# Altium footprint library 排针-排母-1.27.PcbLib: 152 footprints (part 1 of 10)
Each footprint in its own frame and in the unit in brackets; x right, y up, seen from the top. Pads: shape width x height; smd on the part's side, far side on the other; paste and mask are expansions set on the pad; w line width, h text height; cw(c..) or ccw(c..) is an arc to the next point about the centre after c.
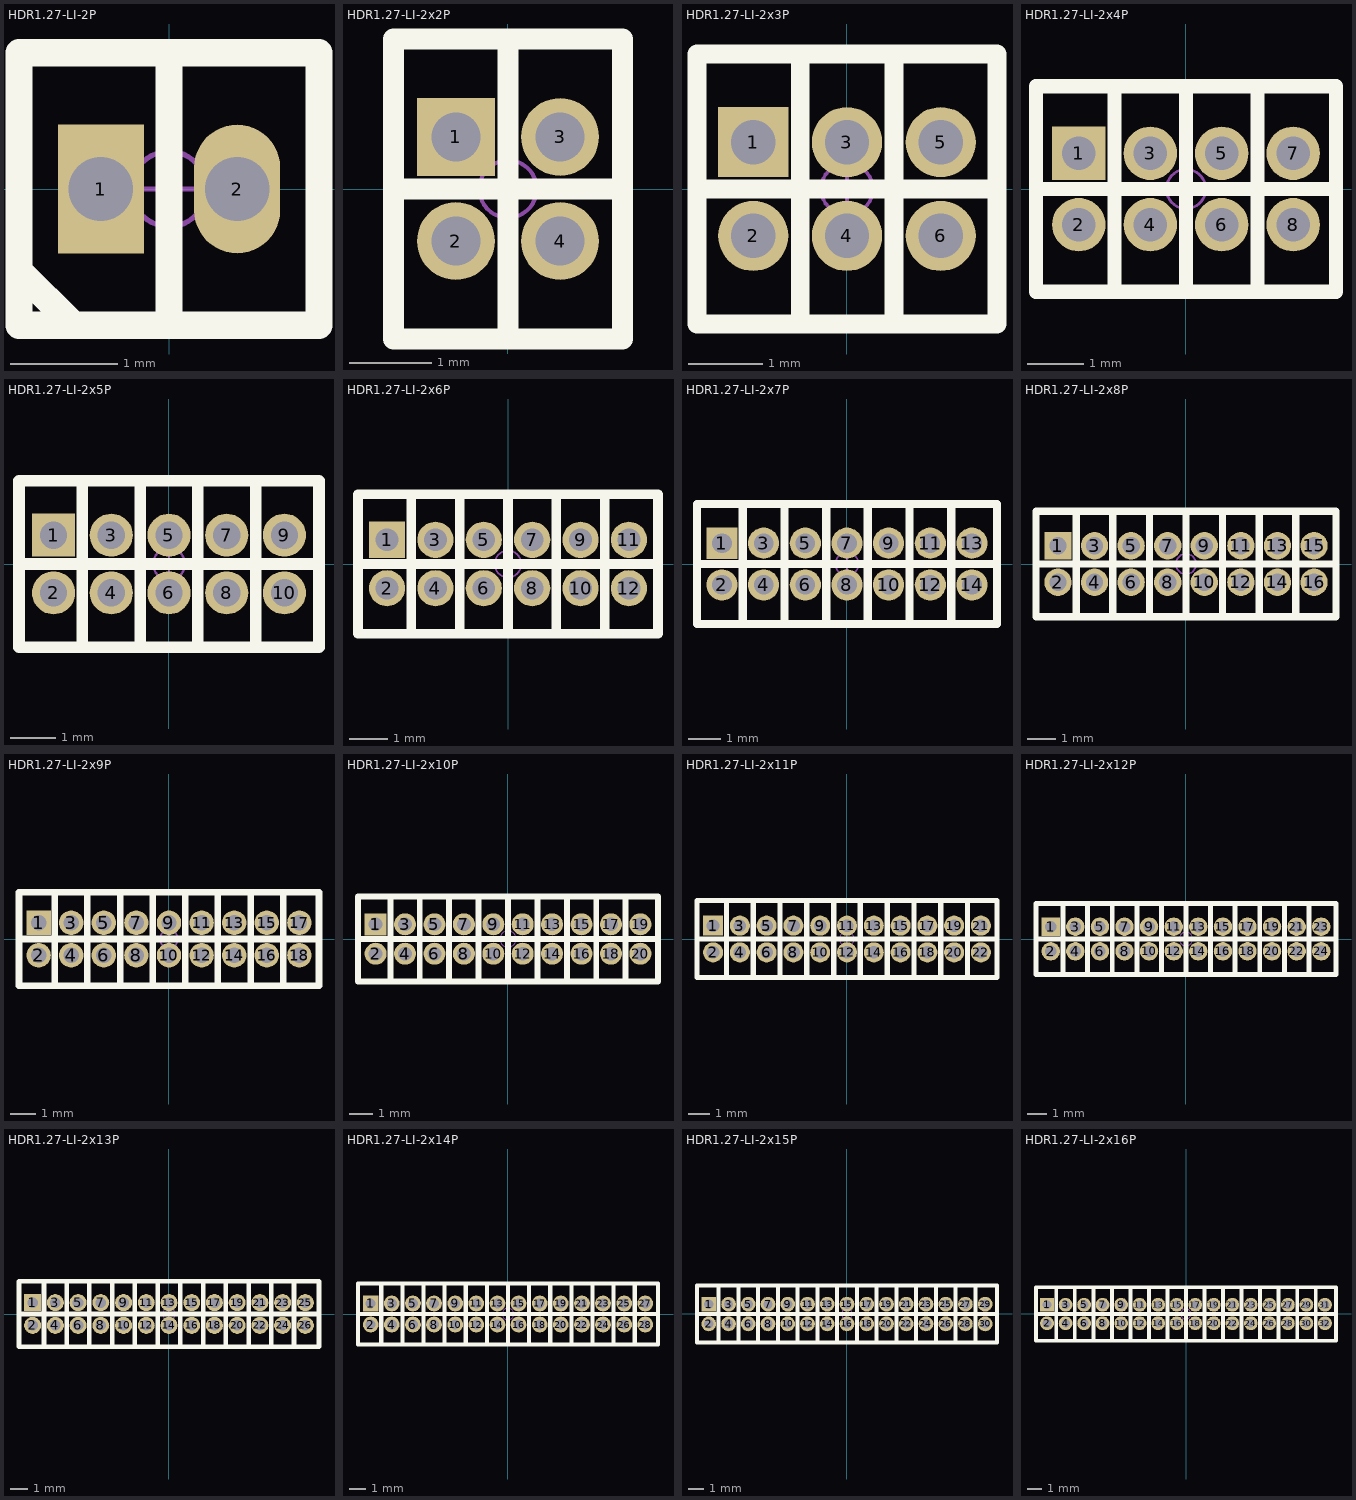
[diagram p0: the footprints below, top view; thin cyan lines are the x and y axes]

## HDR1.27-LI-2P [mm] "直插，脚距：1.27mm"
pads (2):
  rect 0.8x1.2 hole 0.6: 1(-0.635,0)
  oval 0.8x1.2 hole 0.6: 2(0.635,0)
Top Overlay:
  lines w0.254: -1.397,-0.762 -0.889,-1.27 ; 0,-1.27 0,1.27 ; -1.397,-1.27 -1.397,1.27 1.397,1.27 1.397,-1.27 -1.397,-1.27
Mechanical 15:
  circle w0.05: c0,0 r0.35
  lines w0.05: -0.5,0 0.5,0 ; 0,-0.5 0,0.5
3D body: height 4.48, standoff -2.72, extent -1.27,-1.2 1.27,1.2

## HDR1.27-LI-2x2P [mm] "双排直插，脚距：1.27mm"
pads (4):
  rect 0.95x0.95 hole 0.6: 1(-0.635,0.635)
  round 0.95 hole 0.6: 2(-0.635,-0.635) 3(0.635,0.635) 4(0.635,-0.635)
Top Overlay:
  lines w0.254: -1.397,0 1.397,0 ; 0,-1.829 0,1.829 ; -1.397,-1.829 1.397,-1.829 1.397,1.829 -1.397,1.829 -1.397,-1.829
Mechanical 15:
  circle w0.05: c0,0 r0.35
  lines w0.05: -0.5,0 0.5,0 ; 0,-0.5 0,0.5
3D body: height 3.85, standoff -2.65, extent 0,-1.7 1.27,1.7
3D body: height 3.85, standoff -2.65, extent -1.27,-1.7 0,1.7

## HDR1.27-LI-2x3P [mm] "双排直插，脚距：1.27mm"
pads (6):
  rect 0.95x0.95 hole 0.6: 1(-1.27,0.635)
  round 0.95 hole 0.6: 2(-1.27,-0.635) 3(0,0.635) 4(0,-0.635) 5(1.27,0.635) 6(1.27,-0.635)
Top Overlay:
  lines w0.254: -2.032,0 2.032,0 ; -0.635,-1.829 -0.635,1.829 ; 0.635,-1.829 0.635,1.829 ; -2.032,-1.829 -2.032,1.829 2.032,1.829 2.032,-1.829 -2.032,-1.829
Mechanical 15:
  circle w0.05: c0,0 r0.35
  lines w0.05: -0.5,0 0.5,0 ; 0,-0.5 0,0.5
3D body: height 3.85, standoff -2.65, extent -1.905,-1.7 -0.635,1.7
3D body: height 3.85, standoff -2.65, extent -0.635,-1.7 0.635,1.7
3D body: height 3.85, standoff -2.65, extent 0.635,-1.7 1.905,1.7

## HDR1.27-LI-2x4P [mm] "双排直插，脚距：1.27mm"
pads (8):
  rect 0.95x0.95 hole 0.6: 1(-1.905,0.635)
  round 0.95 hole 0.6: 2(-1.905,-0.635) 3(-0.635,0.635) 4(-0.635,-0.635) 5(0.635,0.635) 6(0.635,-0.635) 7(1.905,0.635) 8(1.905,-0.635)
Top Overlay:
  lines w0.254: -2.667,0 2.667,0 ; -1.27,-1.829 -1.27,1.829 ; 0,-1.829 0,1.829 ; 1.27,-1.829 1.27,1.829 ; -2.667,-1.829 -2.667,1.829 2.667,1.829 2.667,-1.829 -2.667,-1.829
Mechanical 15:
  circle w0.05: c0,0 r0.35
  lines w0.05: -0.5,0 0.5,0 ; 0,-0.5 0,0.5
3D body: height 3.85, standoff -2.65, extent 1.27,-1.7 2.54,1.7
3D body: height 3.85, standoff -2.65, extent -2.54,-1.7 -1.27,1.7
3D body: height 3.85, standoff -2.65, extent -1.27,-1.7 0,1.7
3D body: height 3.85, standoff -2.65, extent 0,-1.7 1.27,1.7

## HDR1.27-LI-2x5P [mm] "双排直插，脚距：1.27mm"
pads (10):
  rect 0.95x0.95 hole 0.6: 1(-2.54,0.635)
  round 0.95 hole 0.6: 2(-2.54,-0.635) 3(-1.27,0.635) 4(-1.27,-0.635) 5(0,0.635) 6(0,-0.635) 7(1.27,0.635) 8(1.27,-0.635) 9(2.54,0.635) 10(2.54,-0.635)
Top Overlay:
  lines w0.254: -3.302,0 3.302,0 ; -1.905,-1.829 -1.905,1.829 ; -0.635,-1.829 -0.635,1.829 ; 0.635,-1.829 0.635,1.829 ; 1.905,-1.829 1.905,1.829 ; -3.302,-1.829 3.302,-1.829 3.302,1.829 -3.302,1.829 -3.302,-1.829
Mechanical 15:
  circle w0.05: c0,0 r0.35
  lines w0.05: -0.5,0 0.5,0 ; 0,-0.5 0,0.5
3D body: height 3.85, standoff -2.65, extent -0.635,-1.7 0.635,1.7
3D body: height 3.85, standoff -2.65, extent -1.905,-1.7 -0.635,1.7
3D body: height 3.85, standoff -2.65, extent -3.175,-1.7 -1.905,1.7
3D body: height 3.85, standoff -2.65, extent 0.635,-1.7 1.905,1.7
3D body: height 3.85, standoff -2.65, extent 1.905,-1.7 3.175,1.7

## HDR1.27-LI-2x6P [mm] "双排直插，脚距：1.27mm"
pads (12):
  rect 0.95x0.95 hole 0.6: 1(-3.175,0.635)
  round 0.95 hole 0.6: 2(-3.175,-0.635) 3(-1.905,0.635) 4(-1.905,-0.635) 5(-0.635,0.635) 6(-0.635,-0.635) 7(0.635,0.635) 8(0.635,-0.635) 9(1.905,0.635) 10(1.905,-0.635) 11(3.175,0.635) 12(3.175,-0.635)
Top Overlay:
  lines w0.254: -3.937,0 3.81,0 ; -2.54,-1.829 -2.54,1.829 ; -1.27,-1.829 -1.27,1.829 ; 0,-1.829 0,1.829 ; 1.27,-1.829 1.27,1.829 ; 2.54,-1.829 2.54,1.829 ; -3.937,-1.829 -3.937,1.829 3.937,1.829 3.937,-1.829 -3.937,-1.829
Mechanical 15:
  circle w0.05: c0,0 r0.35
  lines w0.05: -0.5,0 0.5,0 ; 0,-0.5 0,0.5
3D body: height 3.85, standoff -2.65, extent 2.54,-1.7 3.81,1.7
3D body: height 3.85, standoff -2.65, extent 1.27,-1.7 2.54,1.7
3D body: height 3.85, standoff -2.65, extent 0,-1.7 1.27,1.7
3D body: height 3.85, standoff -2.65, extent -3.81,-1.7 -2.54,1.7
3D body: height 3.85, standoff -2.65, extent -2.54,-1.7 -1.27,1.7
3D body: height 3.85, standoff -2.65, extent -1.27,-1.7 0,1.7

## HDR1.27-LI-2x7P [mm] "双排直插，脚距：1.27mm"
pads (14):
  rect 0.95x0.95 hole 0.6: 1(-3.81,0.635)
  round 0.95 hole 0.6: 2(-3.81,-0.635) 3(-2.54,0.635) 4(-2.54,-0.635) 5(-1.27,0.635) 6(-1.27,-0.635) 7(0,0.635) 8(0,-0.635) 9(1.27,0.635) 10(1.27,-0.635) 11(2.54,0.635) 12(2.54,-0.635) 13(3.81,0.635) 14(3.81,-0.635)
Top Overlay:
  lines w0.254: -4.572,0 4.572,0 ; -3.175,-1.829 -3.175,1.829 ; -1.905,-1.829 -1.905,1.829 ; -0.635,-1.829 -0.635,1.829 ; 0.635,-1.829 0.635,1.829 ; 1.905,-1.829 1.905,1.829 ; 3.175,-1.829 3.175,1.829 ; -4.572,-1.829 4.572,-1.829 4.572,1.829 -4.572,1.829 -4.572,-1.829
Mechanical 15:
  circle w0.05: c0,0 r0.35
  lines w0.05: -0.5,0 0.5,0 ; 0,-0.5 0,0.5
3D body: height 3.85, standoff -2.65, extent -1.905,-1.7 -0.635,1.7
3D body: height 3.85, standoff -2.65, extent -3.175,-1.7 -1.905,1.7
3D body: height 3.85, standoff -2.65, extent -4.445,-1.7 -3.175,1.7
3D body: height 3.85, standoff -2.65, extent -0.635,-1.7 0.635,1.7
3D body: height 3.85, standoff -2.65, extent 0.635,-1.7 1.905,1.7
3D body: height 3.85, standoff -2.65, extent 1.905,-1.7 3.175,1.7
3D body: height 3.85, standoff -2.65, extent 3.175,-1.7 4.445,1.7

## HDR1.27-LI-2x8P [mm] "双排直插，脚距：1.27mm"
pads (16):
  rect 0.95x0.95 hole 0.6: 1(-4.445,0.635)
  round 0.95 hole 0.6: 2(-4.445,-0.635) 3(-3.175,0.635) 4(-3.175,-0.635) 5(-1.905,0.635) 6(-1.905,-0.635) 7(-0.635,0.635) 8(-0.635,-0.635) 9(0.635,0.635) 10(0.635,-0.635) 11(1.905,0.635) 12(1.905,-0.635) 13(3.175,0.635) 14(3.175,-0.635) 15(4.445,0.635) 16(4.445,-0.635)
Top Overlay:
  lines w0.254: -5.207,0 5.207,0 ; -3.81,-1.829 -3.81,1.829 ; -2.54,-1.829 -2.54,1.829 ; -1.27,-1.829 -1.27,1.829 ; 0,-1.829 0,1.829 ; 1.27,-1.829 1.27,1.829 ; 2.54,-1.829 2.54,1.829 ; 3.81,-1.829 3.81,1.829 ; -5.207,-1.829 5.207,-1.829 5.207,1.829 -5.207,1.829 -5.207,-1.829
Mechanical 15:
  circle w0.05: c0,0 r0.35
  lines w0.05: -0.5,0 0.5,0 ; 0,-0.5 0,0.5
3D body: height 3.85, standoff -2.65, extent -2.54,-1.7 -1.27,1.7
3D body: height 3.85, standoff -2.65, extent -3.81,-1.7 -2.54,1.7
3D body: height 3.85, standoff -2.65, extent -5.08,-1.7 -3.81,1.7
3D body: height 3.85, standoff -2.65, extent -1.27,-1.7 0,1.7
3D body: height 3.85, standoff -2.65, extent 0,-1.7 1.27,1.7
3D body: height 3.85, standoff -2.65, extent 1.27,-1.7 2.54,1.7
3D body: height 3.85, standoff -2.65, extent 2.54,-1.7 3.81,1.7
3D body: height 3.85, standoff -2.65, extent 3.81,-1.7 5.08,1.7

## HDR1.27-LI-2x9P [mm] "双排直插，脚距：1.27mm"
pads (18):
  rect 0.95x0.95 hole 0.6: 1(-5.08,0.635)
  round 0.95 hole 0.6: 2(-5.08,-0.635) 3(-3.81,0.635) 4(-3.81,-0.635) 5(-2.54,0.635) 6(-2.54,-0.635) 7(-1.27,0.635) 8(-1.27,-0.635) 9(0,0.635) 10(0,-0.635) 11(1.27,0.635) 12(1.27,-0.635) 13(2.54,0.635) 14(2.54,-0.635) 15(3.81,0.635) 16(3.81,-0.635) 17(5.08,0.635) 18(5.08,-0.635)
Top Overlay:
  lines w0.254: -5.842,0 5.842,0 ; -4.445,-1.829 -4.445,1.829 ; -3.175,-1.829 -3.175,1.829 ; -1.905,-1.829 -1.905,1.829 ; -0.635,-1.829 -0.635,1.829 ; 0.635,-1.829 0.635,1.829 ; 1.905,-1.829 1.905,1.829 ; 3.175,-1.829 3.175,1.829 ; 4.445,-1.829 4.445,1.829 ; -5.842,-1.829 5.842,-1.829 5.842,1.829 -5.842,1.829 -5.842,-1.829
Mechanical 15:
  circle w0.05: c0,0 r0.35
  lines w0.05: -0.5,0 0.5,0 ; 0,-0.5 0,0.5
3D body: height 3.85, standoff -2.65, extent -3.175,-1.7 -1.905,1.7
3D body: height 3.85, standoff -2.65, extent -4.445,-1.7 -3.175,1.7
3D body: height 3.85, standoff -2.65, extent -5.715,-1.7 -4.445,1.7
3D body: height 3.85, standoff -2.65, extent -1.905,-1.7 -0.635,1.7
3D body: height 3.85, standoff -2.65, extent -0.635,-1.7 0.635,1.7
3D body: height 3.85, standoff -2.65, extent 0.635,-1.7 1.905,1.7
3D body: height 3.85, standoff -2.65, extent 1.905,-1.7 3.175,1.7
3D body: height 3.85, standoff -2.65, extent 3.175,-1.7 4.445,1.7
3D body: height 3.85, standoff -2.65, extent 4.445,-1.7 5.715,1.7

## HDR1.27-LI-2x10P [mm] "双排直插，脚距：1.27mm"
pads (20):
  rect 0.95x0.95 hole 0.6: 1(-5.715,0.635)
  round 0.95 hole 0.6: 2(-5.715,-0.635) 3(-4.445,0.635) 4(-4.445,-0.635) 5(-3.175,0.635) 6(-3.175,-0.635) 7(-1.905,0.635) 8(-1.905,-0.635) 9(-0.635,0.635) 10(-0.635,-0.635) 11(0.635,0.635) 12(0.635,-0.635) 13(1.905,0.635) 14(1.905,-0.635) 15(3.175,0.635) 16(3.175,-0.635) 17(4.445,0.635) 18(4.445,-0.635) 19(5.715,0.635) 20(5.715,-0.635)
Top Overlay:
  lines w0.254: -6.477,0 6.477,0 ; -5.08,-1.829 -5.08,1.829 ; -3.81,-1.829 -3.81,1.829 ; -2.54,-1.829 -2.54,1.829 ; -1.27,-1.829 -1.27,1.829 ; 0,-1.829 0,1.829 ; 1.27,-1.829 1.27,1.829 ; 2.54,-1.829 2.54,1.829 ; 3.81,-1.829 3.81,1.829 ; 5.08,-1.829 5.08,1.829 ; -6.477,-1.829 -6.477,1.829 6.477,1.829 6.477,-1.829 -6.477,-1.829
Mechanical 15:
  circle w0.05: c0,0 r0.35
  lines w0.05: -0.5,0 0.5,0 ; 0,-0.5 0,0.5
3D body: height 3.85, standoff -2.65, extent 5.08,-1.7 6.35,1.7
3D body: height 3.85, standoff -2.65, extent 3.81,-1.7 5.08,1.7
3D body: height 3.85, standoff -2.65, extent 2.54,-1.7 3.81,1.7
3D body: height 3.85, standoff -2.65, extent 1.27,-1.7 2.54,1.7
3D body: height 3.85, standoff -2.65, extent 0,-1.7 1.27,1.7
3D body: height 3.85, standoff -2.65, extent -1.27,-1.7 0,1.7
3D body: height 3.85, standoff -2.65, extent -2.54,-1.7 -1.27,1.7
3D body: height 3.85, standoff -2.65, extent -6.35,-1.7 -5.08,1.7
3D body: height 3.85, standoff -2.65, extent -5.08,-1.7 -3.81,1.7
3D body: height 3.85, standoff -2.65, extent -3.81,-1.7 -2.54,1.7

## HDR1.27-LI-2x11P [mm] "双排直插，脚距：1.27mm"
pads (22):
  rect 0.95x0.95 hole 0.6: 1(-6.35,0.635)
  round 0.95 hole 0.6: 2(-6.35,-0.635) 3(-5.08,0.635) 4(-5.08,-0.635) 5(-3.81,0.635) 6(-3.81,-0.635) 7(-2.54,0.635) 8(-2.54,-0.635) 9(-1.27,0.635) 10(-1.27,-0.635) 11(0,0.635) 12(0,-0.635) 13(1.27,0.635) 14(1.27,-0.635) 15(2.54,0.635) 16(2.54,-0.635) 17(3.81,0.635) 18(3.81,-0.635) 19(5.08,0.635) 20(5.08,-0.635) 21(6.35,0.635) 22(6.35,-0.635)
Top Overlay:
  lines w0.254: -7.112,0 7.112,0 ; -5.715,-1.829 -5.715,1.829 ; -4.445,-1.829 -4.445,1.829 ; -3.175,-1.829 -3.175,1.829 ; -1.905,-1.829 -1.905,1.829 ; -0.635,-1.829 -0.635,1.829 ; 0.635,-1.829 0.635,1.829 ; 1.905,-1.829 1.905,1.829 ; 3.175,-1.829 3.175,1.829 ; 4.445,-1.829 4.445,1.829 ; 5.715,-1.829 5.715,1.829 ; -7.112,-1.829 7.112,-1.829 7.112,1.829 -7.112,1.829 -7.112,-1.829
Mechanical 15:
  circle w0.05: c0,0 r0.35
  lines w0.05: -0.5,0 0.5,0 ; 0,-0.5 0,0.5
3D body: height 3.85, standoff -2.65, extent -4.445,-1.7 -3.175,1.7
3D body: height 3.85, standoff -2.65, extent -5.715,-1.7 -4.445,1.7
3D body: height 3.85, standoff -2.65, extent -6.985,-1.7 -5.715,1.7
3D body: height 3.85, standoff -2.65, extent -3.175,-1.7 -1.905,1.7
3D body: height 3.85, standoff -2.65, extent -1.905,-1.7 -0.635,1.7
3D body: height 3.85, standoff -2.65, extent -0.635,-1.7 0.635,1.7
3D body: height 3.85, standoff -2.65, extent 0.635,-1.7 1.905,1.7
3D body: height 3.85, standoff -2.65, extent 1.905,-1.7 3.175,1.7
3D body: height 3.85, standoff -2.65, extent 3.175,-1.7 4.445,1.7
3D body: height 3.85, standoff -2.65, extent 4.445,-1.7 5.715,1.7
3D body: height 3.85, standoff -2.65, extent 5.715,-1.7 6.985,1.7

## HDR1.27-LI-2x12P [mm] "双排直插，脚距：1.27mm"
pads (24):
  rect 0.95x0.95 hole 0.6: 1(-6.985,0.635)
  round 0.95 hole 0.6: 2(-6.985,-0.635) 3(-5.715,0.635) 4(-5.715,-0.635) 5(-4.445,0.635) 6(-4.445,-0.635) 7(-3.175,0.635) 8(-3.175,-0.635) 9(-1.905,0.635) 10(-1.905,-0.635) 11(-0.635,0.635) 12(-0.635,-0.635) 13(0.635,0.635) 14(0.635,-0.635) 15(1.905,0.635) 16(1.905,-0.635) 17(3.175,0.635) 18(3.175,-0.635) 19(4.445,0.635) 20(4.445,-0.635) 21(5.715,0.635) 22(5.715,-0.635) 23(6.985,0.635) 24(6.985,-0.635)
Top Overlay:
  lines w0.254: -7.747,0 7.747,0 ; -6.35,-1.829 -6.35,1.829 ; -5.08,-1.829 -5.08,1.829 ; -3.81,-1.829 -3.81,1.829 ; -2.54,-1.829 -2.54,1.829 ; -1.27,-1.829 -1.27,1.829 ; 0,-1.829 0,1.829 ; 1.27,-1.829 1.27,1.829 ; 2.54,-1.829 2.54,1.829 ; 3.81,-1.829 3.81,1.829 ; 5.08,-1.829 5.08,1.829 ; 6.35,-1.829 6.35,1.829 ; -7.747,-1.829 7.747,-1.829 7.747,1.829 -7.747,1.829 -7.747,-1.829
Mechanical 15:
  circle w0.05: c0,0 r0.35
  lines w0.05: -0.5,0 0.5,0 ; 0,-0.5 0,0.5
3D body: height 3.85, standoff -2.65, extent -5.08,-1.7 -3.81,1.7
3D body: height 3.85, standoff -2.65, extent -6.35,-1.7 -5.08,1.7
3D body: height 3.85, standoff -2.65, extent -7.62,-1.7 -6.35,1.7
3D body: height 3.85, standoff -2.65, extent -3.81,-1.7 -2.54,1.7
3D body: height 3.85, standoff -2.65, extent -2.54,-1.7 -1.27,1.7
3D body: height 3.85, standoff -2.65, extent -1.27,-1.7 0,1.7
3D body: height 3.85, standoff -2.65, extent 0,-1.7 1.27,1.7
3D body: height 3.85, standoff -2.65, extent 1.27,-1.7 2.54,1.7
3D body: height 3.85, standoff -2.65, extent 2.54,-1.7 3.81,1.7
3D body: height 3.85, standoff -2.65, extent 3.81,-1.7 5.08,1.7
3D body: height 3.85, standoff -2.65, extent 5.08,-1.7 6.35,1.7
3D body: height 3.85, standoff -2.65, extent 6.35,-1.7 7.62,1.7

## HDR1.27-LI-2x13P [mm] "双排直插，脚距：1.27mm"
pads (26):
  rect 0.95x0.95 hole 0.6: 1(-7.62,0.635)
  round 0.95 hole 0.6: 2(-7.62,-0.635) 3(-6.35,0.635) 4(-6.35,-0.635) 5(-5.08,0.635) 6(-5.08,-0.635) 7(-3.81,0.635) 8(-3.81,-0.635) 9(-2.54,0.635) 10(-2.54,-0.635) 11(-1.27,0.635) 12(-1.27,-0.635) 13(0,0.635) 14(0,-0.635) 15(1.27,0.635) 16(1.27,-0.635) 17(2.54,0.635) 18(2.54,-0.635) 19(3.81,0.635) 20(3.81,-0.635) 21(5.08,0.635) 22(5.08,-0.635) 23(6.35,0.635) 24(6.35,-0.635) 25(7.62,0.635) 26(7.62,-0.635)
Top Overlay:
  lines w0.254: -8.382,0 8.382,0 ; -6.985,-1.829 -6.985,1.829 ; -5.715,-1.829 -5.715,1.829 ; -4.445,-1.829 -4.445,1.829 ; -3.175,-1.829 -3.175,1.829 ; -1.905,-1.829 -1.905,1.829 ; -0.635,-1.829 -0.635,1.829 ; 0.635,-1.829 0.635,1.829 ; 1.905,-1.829 1.905,1.829 ; 3.175,-1.829 3.175,1.829 ; 4.445,-1.829 4.445,1.829 ; 5.715,-1.829 5.715,1.829 ; 6.985,-1.829 6.985,1.829 ; -8.382,-1.829 -8.382,1.829 8.382,1.829 8.382,-1.829 -8.382,-1.829
Mechanical 15:
  circle w0.05: c0,0 r0.35
  lines w0.05: -0.5,0 0.5,0 ; 0,-0.5 0,0.5
3D body: height 3.85, standoff -2.65, extent 6.985,-1.7 8.255,1.7
3D body: height 3.85, standoff -2.65, extent 5.715,-1.7 6.985,1.7
3D body: height 3.85, standoff -2.65, extent 4.445,-1.7 5.715,1.7
3D body: height 3.85, standoff -2.65, extent 3.175,-1.7 4.445,1.7
3D body: height 3.85, standoff -2.65, extent 1.905,-1.7 3.175,1.7
3D body: height 3.85, standoff -2.65, extent 0.635,-1.7 1.905,1.7
3D body: height 3.85, standoff -2.65, extent -0.635,-1.7 0.635,1.7
3D body: height 3.85, standoff -2.65, extent -1.905,-1.7 -0.635,1.7
3D body: height 3.85, standoff -2.65, extent -3.175,-1.7 -1.905,1.7
3D body: height 3.85, standoff -2.65, extent -4.445,-1.7 -3.175,1.7
3D body: height 3.85, standoff -2.65, extent -8.255,-1.7 -6.985,1.7
3D body: height 3.85, standoff -2.65, extent -6.985,-1.7 -5.715,1.7
3D body: height 3.85, standoff -2.65, extent -5.715,-1.7 -4.445,1.7

## HDR1.27-LI-2x14P [mm] "双排直插，脚距：1.27mm"
pads (28):
  rect 0.95x0.95 hole 0.6: 1(-8.255,0.635)
  round 0.95 hole 0.6: 2(-8.255,-0.635) 3(-6.985,0.635) 4(-6.985,-0.635) 5(-5.715,0.635) 6(-5.715,-0.635) 7(-4.445,0.635) 8(-4.445,-0.635) 9(-3.175,0.635) 10(-3.175,-0.635) 11(-1.905,0.635) 12(-1.905,-0.635) 13(-0.635,0.635) 14(-0.635,-0.635) 15(0.635,0.635) 16(0.635,-0.635) 17(1.905,0.635) 18(1.905,-0.635) 19(3.175,0.635) 20(3.175,-0.635) 21(4.445,0.635) 22(4.445,-0.635) 23(5.715,0.635) 24(5.715,-0.635) 25(6.985,0.635) 26(6.985,-0.635) 27(8.255,0.635) 28(8.255,-0.635)
Top Overlay:
  lines w0.254: -9.017,0 9.017,0 ; -7.62,-1.829 -7.62,1.829 ; -6.35,-1.829 -6.35,1.829 ; -5.08,-1.829 -5.08,1.829 ; -3.81,-1.829 -3.81,1.829 ; -2.54,-1.829 -2.54,1.829 ; -1.27,-1.829 -1.27,1.829 ; 0,-1.829 0,1.829 ; 1.27,-1.829 1.27,1.829 ; 2.54,-1.829 2.54,1.829 ; 3.81,-1.829 3.81,1.829 ; 5.08,-1.829 5.08,1.829 ; 6.35,-1.829 6.35,1.829 ; 7.62,-1.829 7.62,1.829 ; -9.017,-1.829 -9.017,1.829 9.017,1.829 9.017,-1.829 -9.017,-1.829
Mechanical 15:
  circle w0.05: c0,0 r0.35
  lines w0.05: -0.5,0 0.5,0 ; 0,-0.5 0,0.5
3D body: height 3.85, standoff -2.65, extent 7.62,-1.7 8.89,1.7
3D body: height 3.85, standoff -2.65, extent 6.35,-1.7 7.62,1.7
3D body: height 3.85, standoff -2.65, extent 5.08,-1.7 6.35,1.7
3D body: height 3.85, standoff -2.65, extent 3.81,-1.7 5.08,1.7
3D body: height 3.85, standoff -2.65, extent 2.54,-1.7 3.81,1.7
3D body: height 3.85, standoff -2.65, extent 1.27,-1.7 2.54,1.7
3D body: height 3.85, standoff -2.65, extent 0,-1.7 1.27,1.7
3D body: height 3.85, standoff -2.65, extent -1.27,-1.7 0,1.7
3D body: height 3.85, standoff -2.65, extent -2.54,-1.7 -1.27,1.7
3D body: height 3.85, standoff -2.65, extent -3.81,-1.7 -2.54,1.7
3D body: height 3.85, standoff -2.65, extent -5.08,-1.7 -3.81,1.7
3D body: height 3.85, standoff -2.65, extent -8.89,-1.7 -7.62,1.7
3D body: height 3.85, standoff -2.65, extent -7.62,-1.7 -6.35,1.7
3D body: height 3.85, standoff -2.65, extent -6.35,-1.7 -5.08,1.7

## HDR1.27-LI-2x15P [mm] "双排直插，脚距：1.27mm"
pads (30):
  rect 0.95x0.95 hole 0.6: 1(-8.89,0.635)
  round 0.95 hole 0.6: 2(-8.89,-0.635) 3(-7.62,0.635) 4(-7.62,-0.635) 5(-6.35,0.635) 6(-6.35,-0.635) 7(-5.08,0.635) 8(-5.08,-0.635) 9(-3.81,0.635) 10(-3.81,-0.635) 11(-2.54,0.635) 12(-2.54,-0.635) 13(-1.27,0.635) 14(-1.27,-0.635) 15(0,0.635) 16(0,-0.635) 17(1.27,0.635) 18(1.27,-0.635) 19(2.54,0.635) 20(2.54,-0.635) 21(3.81,0.635) 22(3.81,-0.635) 23(5.08,0.635) 24(5.08,-0.635) 25(6.35,0.635) 26(6.35,-0.635) 27(7.62,0.635) 28(7.62,-0.635) 29(8.89,0.635) 30(8.89,-0.635)
Top Overlay:
  lines w0.254: -9.652,0 9.652,0 ; -8.255,-1.829 -8.255,1.829 ; -6.985,-1.829 -6.985,1.829 ; -5.715,-1.829 -5.715,1.829 ; -4.445,-1.829 -4.445,1.829 ; -3.175,-1.829 -3.175,1.829 ; -1.905,-1.829 -1.905,1.829 ; -0.635,-1.829 -0.635,1.829 ; 0.635,-1.829 0.635,1.829 ; 1.905,-1.829 1.905,1.829 ; 3.175,-1.829 3.175,1.829 ; 4.445,-1.829 4.445,1.829 ; 5.715,-1.829 5.715,1.829 ; 6.985,-1.829 6.985,1.829 ; 8.255,-1.829 8.255,1.829 ; -9.652,-1.829 9.652,-1.829 9.652,1.829 -9.652,1.829 -9.652,-1.829
Mechanical 15:
  circle w0.05: c0,0 r0.35
  lines w0.05: -0.5,0 0.5,0 ; 0,-0.5 0,0.5
3D body: height 3.85, standoff -2.65, extent -6.985,-1.7 -5.715,1.7
3D body: height 3.85, standoff -2.65, extent -8.255,-1.7 -6.985,1.7
3D body: height 3.85, standoff -2.65, extent -9.525,-1.7 -8.255,1.7
3D body: height 3.85, standoff -2.65, extent -5.715,-1.7 -4.445,1.7
3D body: height 3.85, standoff -2.65, extent -4.445,-1.7 -3.175,1.7
3D body: height 3.85, standoff -2.65, extent -3.175,-1.7 -1.905,1.7
3D body: height 3.85, standoff -2.65, extent -1.905,-1.7 -0.635,1.7
3D body: height 3.85, standoff -2.65, extent -0.635,-1.7 0.635,1.7
3D body: height 3.85, standoff -2.65, extent 0.635,-1.7 1.905,1.7
3D body: height 3.85, standoff -2.65, extent 1.905,-1.7 3.175,1.7
3D body: height 3.85, standoff -2.65, extent 3.175,-1.7 4.445,1.7
3D body: height 3.85, standoff -2.65, extent 4.445,-1.7 5.715,1.7
3D body: height 3.85, standoff -2.65, extent 5.715,-1.7 6.985,1.7
3D body: height 3.85, standoff -2.65, extent 6.985,-1.7 8.255,1.7
3D body: height 3.85, standoff -2.65, extent 8.255,-1.7 9.525,1.7

## HDR1.27-LI-2x16P [mm] "双排直插，脚距：1.27mm"
pads (32):
  rect 0.95x0.95 hole 0.6: 1(-9.525,0.635)
  round 0.95 hole 0.6: 2(-9.525,-0.635) 3(-8.255,0.635) 4(-8.255,-0.635) 5(-6.985,0.635) 6(-6.985,-0.635) 7(-5.715,0.635) 8(-5.715,-0.635) 9(-4.445,0.635) 10(-4.445,-0.635) 11(-3.175,0.635) 12(-3.175,-0.635) 13(-1.905,0.635) 14(-1.905,-0.635) 15(-0.635,0.635) 16(-0.635,-0.635) 17(0.635,0.635) 18(0.635,-0.635) 19(1.905,0.635) 20(1.905,-0.635) 21(3.175,0.635) 22(3.175,-0.635) 23(4.445,0.635) 24(4.445,-0.635) 25(5.715,0.635) 26(5.715,-0.635) 27(6.985,0.635) 28(6.985,-0.635) 29(8.255,0.635) 30(8.255,-0.635) 31(9.525,0.635) 32(9.525,-0.635)
Top Overlay:
  lines w0.254: -10.287,0 10.287,0 ; -8.89,-1.829 -8.89,1.829 ; -7.62,-1.829 -7.62,1.829 ; -6.35,-1.829 -6.35,1.829 ; -5.08,-1.829 -5.08,1.829 ; -3.81,-1.829 -3.81,1.829 ; -2.54,-1.829 -2.54,1.829 ; -1.27,-1.829 -1.27,1.829 ; 0,-1.829 0,1.829 ; 1.27,-1.829 1.27,1.829 ; 2.54,-1.829 2.54,1.829 ; 3.81,-1.829 3.81,1.829 ; 5.08,-1.829 5.08,1.829 ; 6.35,-1.829 6.35,1.829 ; 7.62,-1.829 7.62,1.829 ; 8.89,-1.829 8.89,1.829 ; -10.287,-1.829 -10.287,1.829 10.287,1.829 10.287,-1.829 -10.287,-1.829
Mechanical 15:
  circle w0.05: c0,0 r0.35
  lines w0.05: -0.5,0 0.5,0 ; 0,-0.5 0,0.5
3D body: height 3.85, standoff -2.65, extent 8.89,-1.7 10.16,1.7
3D body: height 3.85, standoff -2.65, extent 7.62,-1.7 8.89,1.7
3D body: height 3.85, standoff -2.65, extent 6.35,-1.7 7.62,1.7
3D body: height 3.85, standoff -2.65, extent 5.08,-1.7 6.35,1.7
3D body: height 3.85, standoff -2.65, extent 3.81,-1.7 5.08,1.7
3D body: height 3.85, standoff -2.65, extent 2.54,-1.7 3.81,1.7
3D body: height 3.85, standoff -2.65, extent 1.27,-1.7 2.54,1.7
3D body: height 3.85, standoff -2.65, extent 0,-1.7 1.27,1.7
3D body: height 3.85, standoff -2.65, extent -1.27,-1.7 0,1.7
3D body: height 3.85, standoff -2.65, extent -2.54,-1.7 -1.27,1.7
3D body: height 3.85, standoff -2.65, extent -3.81,-1.7 -2.54,1.7
3D body: height 3.85, standoff -2.65, extent -5.08,-1.7 -3.81,1.7
3D body: height 3.85, standoff -2.65, extent -6.35,-1.7 -5.08,1.7
3D body: height 3.85, standoff -2.65, extent -10.16,-1.7 -8.89,1.7
3D body: height 3.85, standoff -2.65, extent -8.89,-1.7 -7.62,1.7
3D body: height 3.85, standoff -2.65, extent -7.62,-1.7 -6.35,1.7